# Altium footprint library 集大电协1.2.PcbLib: 197 footprints (part 12 of 13)
Each footprint in its own frame and in the unit in brackets; x right, y up, seen from the top. Pads: shape width x height; smd on the part's side, far side on the other; paste and mask are expansions set on the pad; w line width, h text height; cw(c..) or ccw(c..) is an arc to the next point about the centre after c.
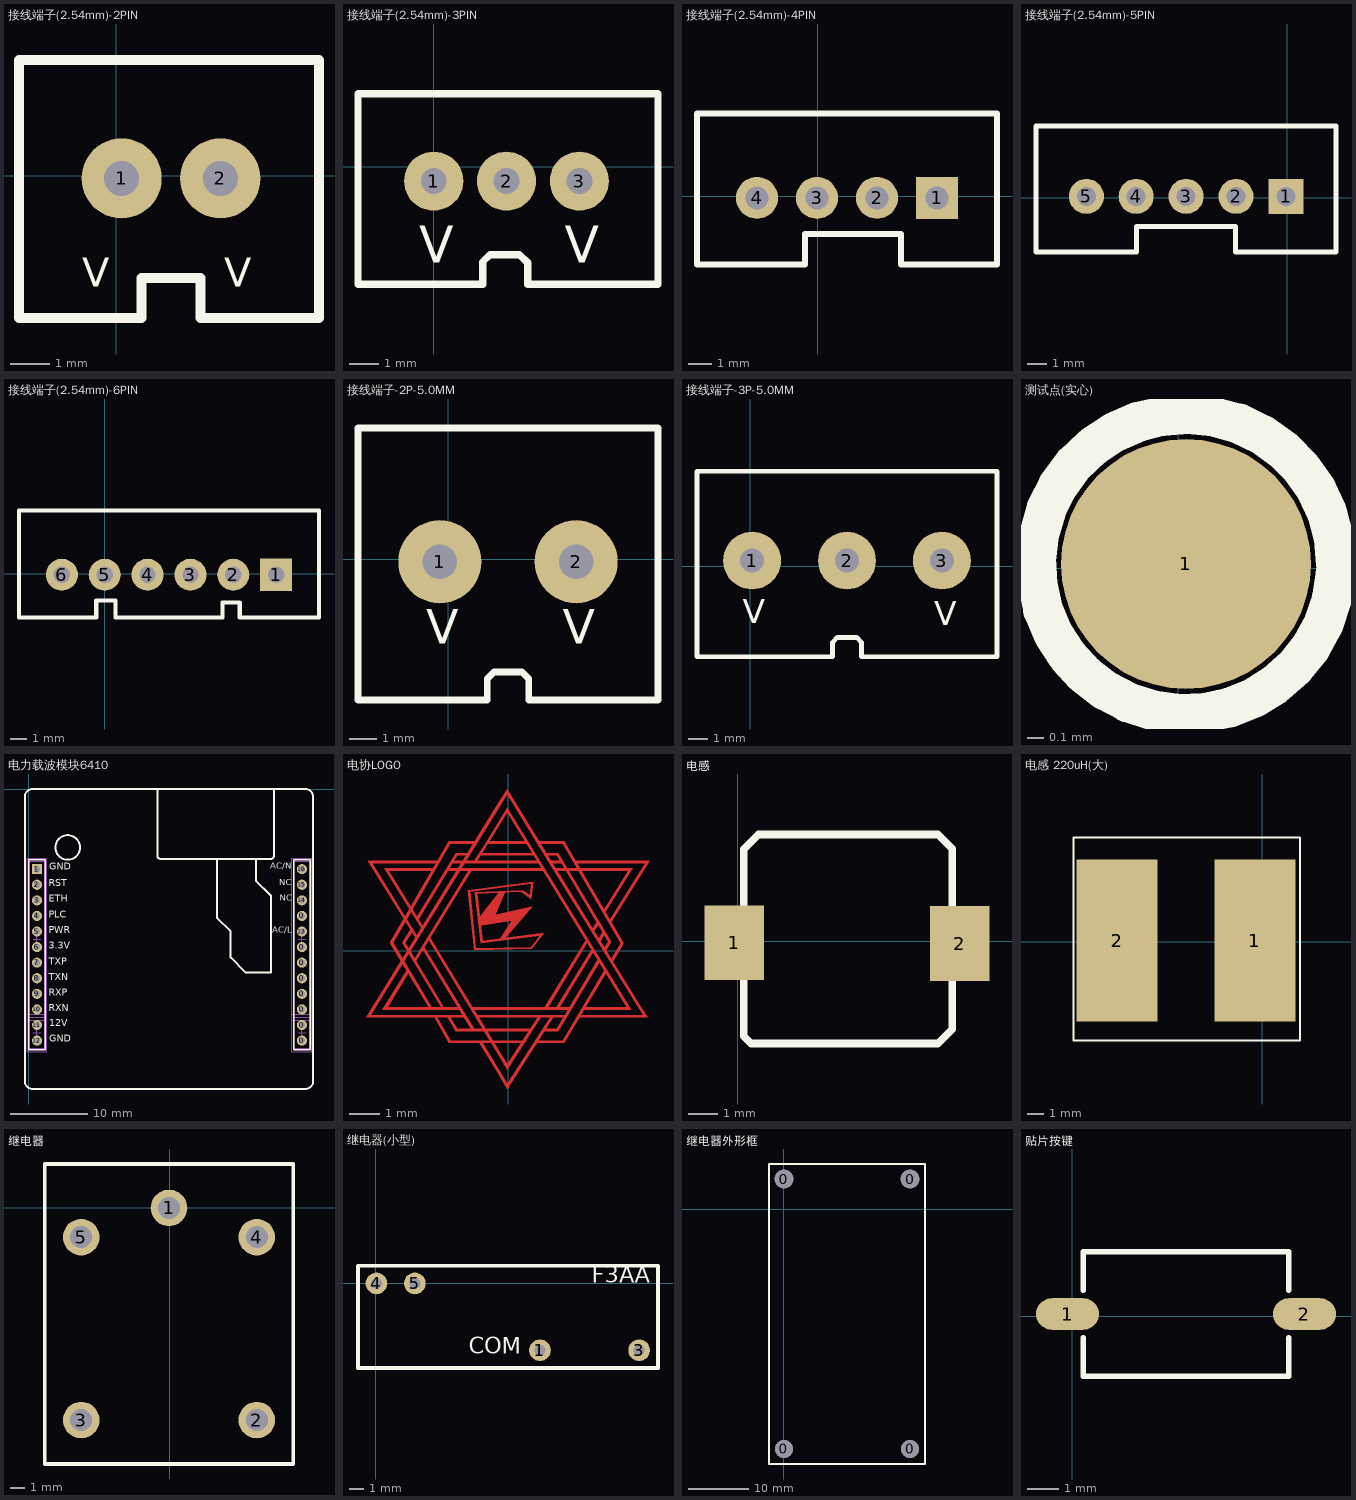
[diagram p11: the footprints below, top view; thin cyan lines are the x and y axes]

## 接线端子(2.54mm)-2PIN [mil]
pads (2):
  round 80 hole 35: 1(5.42,-2.44) 2(103.84,-2.44)
Top Overlay:
  lines w10: 141.42,-141.76 202.27,-141.76 202.27,115.67 -96.94,115.67 -96.94,-141.76 25.1,-141.76 25.1,-101.76 84.16,-101.76 84.16,-141.76 151.42,-141.76
  text "V" at -33.95,-120.55 h50
  text "V" at 107.78,-120.55 h50
3D body: height 459.84, standoff -140.16, extent -48.52,-139.05 151.48,110.95

## 接线端子(2.54mm)-3PIN [mil]
pads (3):
  round 80 hole 35: 1(0,-19.68) 2(98.43,-19.68) 3(196.85,-19.68)
Top Overlay:
  lines w10: 136,-159 303.15,-159 303.15,98.43 -102.36,98.43 -102.36,-159 66,-159 66,-129 76,-119 116,-119 127,-130 127,-159 146,-159
  text "V" at 177.17,-129.92 h50
  text "V" at -19.68,-129.92 h50
3D body: height 459.84, standoff -140.16, extent -51.57,-157.48 248.43,92.52

## 接线端子(2.54mm)-4PIN [mil]
pads (4):
  rect 70x70 hole 38: 1(199.11,-3)
  round 70 hole 38: 2(99.11,-3) 3(-0.89,-3) 4(-100.89,-3)
Top Overlay:
  lines w10: -200.89,-114.17 -200.89,137.8 299.11,137.8 299.11,-114.17 139.11,-114.17 139.11,-63 -0.89,-63 -20.89,-63 -20.89,-114.17 -200.89,-114.17
3D body: height 459.84, standoff -140.16, extent -148.82,-118.11 251.18,131.89

## 接线端子(2.54mm)-5PIN [mil]
pads (5):
  rect 70x70 hole 38: 1(-2.66,2.91)
  round 70 hole 38: 2(-102.66,2.91) 3(-202.66,2.91) 4(-302.66,2.91) 5(-402.07,2.91)
Top Overlay:
  lines w10: -502.95,-108.27 -502.95,143.7 97.34,143.7 97.34,-108.27 -103.35,-108.27 -103.35,-57.09 -202.66,-57.09 -302.17,-57.09 -302.17,-108.27 -502.95,-108.27
3D body: height 236.22, standoff -98.43, extent -493.11,-78.74 97.44,70.87

## 接线端子(2.54mm)-6PIN [mil]
pads (6):
  rect 75x75 hole 38: 1(399.35,-2.1)
  round 75 hole 38: 2(299.35,-2.1) 3(199.35,-2.1) 4(99.35,-2.1) 5(-0.65,-2.1) 6(-100.65,-2.1)
Top Overlay:
  lines w10: -200.65,-102.1 -20.65,-102.1 -20.65,-62.1 14.35,-62.1 24.35,-62.1 24.35,-102.1 274.35,-102.1 274.35,-67.1 314.35,-67.1 314.35,-102.1 499.35,-102.1 499.35,147.9 -200.65,147.9 -200.65,-102.1
3D body: height 236.22, standoff -78.74, extent -125.98,-74.8 425.2,102.36

## 接线端子-2P-5.0MM [mil]
pads (2):
  round 120 hole 50: 1(-11.81,-3.94) 2(185.04,-3.94)
Top Overlay:
  lines w10: -129.92,-203.31 56.61,-203.31 56.61,-173.31 66.61,-163.31 106.61,-163.31 116.61,-173.31 116.61,-203.31 136.61,-203.31 ; -129.92,-200.79 -129.92,188.98 303.15,188.98 303.15,-200.79 ; 126.61,-203.31 303.15,-203.31
  text "V" at 165.35,-122.05 h50
  text "V" at -31.5,-122.05 h50
3D body: height 433.07, standoff -78.74, extent -106.3,-153.54 287.4,161.42

## 接线端子-3P-5.0MM [mil]
pads (3):
  round 120 hole 50: 1(3.94,11.81) 2(200.79,11.81) 3(397.64,11.81)
Top Overlay:
  lines w10: -110.24,-187.56 170.79,-187.56 170.79,-157.56 180.79,-147.56 220.79,-147.56 230.79,-157.56 230.79,-187.56 511.81,-187.56 511.81,196.85 -110.24,196.85 -110.24,-187.56
  text "V" at -15.75,-118.11 h50
  text "V" at 381.89,-122.05 h50
3D body: height 433.07, standoff -78.74, extent -94.49,-153.54 496.06,161.42

## 测试点(实心) [mm]
pads (1):
  round 1.5 all layers, no hole: 1(0.048,0.025)
Top Overlay:
  lines w0.24: 0.946,-0.035 cw(c0.048,0.025) 0.948,0.025

## 电力载波模块6410 [mm]
pads (24):
  round 1.3 hole 0.8: 0(35.059,-32.289) 0(35.059,-30.289) 0(35.059,-28.289) 0(35.059,-26.289) 0(35.059,-24.289) 0(35.059,-22.289) 0(35.059,-20.289) 0(35.059,-16.289) 2(1.059,-12.289) 3(1.059,-14.289) 4(1.059,-16.289) 5(1.059,-18.289) 6(1.059,-20.289) 7(1.059,-22.289) 8(1.059,-24.289) 9(1.059,-26.289) 10(1.059,-28.289) 11(1.059,-30.289) 12(1.059,-32.289) 13(35.059,-18.289) 14(35.059,-14.289) 15(35.059,-12.289) 16(35.059,-10.289)
  rect 1.3x1.3 hole 0.8: 1(1.059,-10.289)
Top Overlay:
  circle w0.254: c5,-7.5 r1.581
  lines w0.2: -0.016,-29.489 -0.016,-9.089 2.134,-9.089 2.134,-29.489 ; -0.016,-29.089 -0.016,-33.489 2.134,-33.489 2.134,-29.089 ; 33.984,-29.489 33.984,-9.089 36.134,-9.089 36.134,-29.489 ; 33.984,-29.089 33.984,-33.489 36.134,-33.489 36.134,-29.089
  lines w0.254: 16.5,0 16.5,-8.5 ccw(c17,-8.5) 17,-9 31,-9 ccw(c31,-8.5) 31.5,-8.5 31.5,0 ; 24.181,-9.068 24.181,-16.561 24.206,-16.561 25.908,-18.263 25.908,-19.279 25.908,-21.59 ; 25.933,-21.615 25.908,-21.59 ; 29.159,-9.144 29.159,-11.76 31.064,-13.665 31.064,-23.52 27.813,-23.52 25.908,-21.615 25.908,-21.59 ; -0.5,-37.5 ccw(c0.5,-37.5) 0.5,-38.5 35.5,-38.5 ccw(c35.5,-37.5) 36.5,-37.5 36.5,-1 ccw(c35.5,-1) 35.5,0 0.5,0 ccw(c0.5,-1) -0.5,-1 -0.5,-37.5
  text "NC" at 32.182,-14.63 h1.4
  text "NC" at 32.156,-12.675 h1.4
  text "AC/L" at 31.242,-18.745 h1.4
  text "AC/N" at 30.963,-10.541 h1.4
  text "GND" at 2.642,-32.766 h1.52
  text "12V" at 2.64,-30.773 h1.52
  text "RXN" at 2.54,-28.867 h1.52
  text "RXP" at 2.54,-26.86 h1.52
  text "TXN" at 2.542,-24.854 h1.52
  text "TXP" at 2.542,-22.847 h1.52
  text "3.3V" at 2.54,-20.826 h1.52
  text "PWR" at 2.54,-18.834 h1.52
  text "PLC" at 2.54,-16.813 h1.52
  text "ETH" at 2.54,-14.821 h1.52
  text "RST" at 2.54,-12.8 h1.52
  text "GND" at 2.642,-10.693 h1.52
Mechanical 13:
  lines w0.1: 0.059,-29.289 2.059,-29.289 ; 0.059,-29.289 0.059,-33.289 2.059,-33.289 2.059,-29.289 ; 0.059,-29.289 0.059,-9.289 2.059,-9.289 2.059,-29.289 ; 0.059,-29.289 2.059,-29.289 ; 34.059,-29.289 36.059,-29.289 ; 34.059,-29.289 34.059,-9.289 36.059,-9.289 36.059,-29.289 ; 34.059,-29.289 34.059,-33.289 36.059,-33.289 36.059,-29.289 ; 34.059,-29.289 36.059,-29.289
Mechanical 15:
  lines w0.05: 0.559,-31.289 1.559,-31.289 ; 0.559,-19.289 1.559,-19.289 ; 1.059,-31.789 1.059,-30.789 ; 1.059,-19.789 1.059,-18.789 ; 34.559,-31.289 35.559,-31.289 ; 34.559,-19.289 35.559,-19.289 ; 35.059,-31.789 35.059,-30.789 ; 35.059,-19.789 35.059,-18.789 ; -0.216,-33.689 -0.216,-28.889 2.334,-28.889 2.334,-33.689 -0.216,-33.689 ; -0.216,-29.689 -0.216,-8.889 2.334,-8.889 2.334,-29.689 -0.216,-29.689 ; 33.784,-33.689 36.334,-33.689 36.334,-28.889 33.784,-28.889 33.784,-33.689 ; 33.784,-29.689 36.334,-29.689 36.334,-8.889 33.784,-8.889 33.784,-29.689
3D body "62001011821.stp": height 4.35, standoff -2.65, extent 33.897,-29.42 36.397,-8.92
3D body "62000211821.stp": height 4.35, standoff -2.65, extent 33.887,-33.466 36.387,-28.966
3D body "62000211821.stp": height 4.35, standoff -2.65, extent -0.149,-33.416 2.351,-28.916
3D body "62001011821.stp": height 4.35, standoff -2.65, extent -0.139,-29.369 2.361,-8.869

## 电协LOGO [mm]
Top Layer:
  region: -0.307,1.911 -0.961,1.079 -0.917,0.832 0.124,0.984 -0.282,0.374 -0.13,0.374 0.81,1.467 -0.422,1.187 -0.092,1.949
  region: -0.028,5.327 -0.307,4.896 -4.676,-2.191 -4.473,-2.191 -1.45,-2.192 -1.4,-2.115 -1.568,-1.834 -1.654,-1.861 -3.965,-1.861 -3.279,-0.743 -3.33,-0.642 -4.143,-1.937 -1.603,-1.937 -1.488,-2.115 -4.524,-2.115 -0.028,5.15 1.344,2.914 4.442,-2.115 2.41,-2.115 2.36,-2.191 4.595,-2.191 4.341,-1.785
  region: -1.12,2.965 -0.765,3.499 -0.028,4.718 4.061,-1.937 2.512,-1.937 2.563,-1.861 3.909,-1.861 -0.028,4.565 -1.019,2.965
  region: 1.242,3.219 1.648,3.219 3.401,0.298 3.223,-0.007 3.172,0.095 3.299,0.298 1.598,3.143 1.293,3.143
  region: -1.171,-1.861 0.607,-1.861 2.029,-1.861 2.004,-1.937 -1.171,-1.937
  region: -1.019,-2.115 0.759,-2.115 1.928,-2.115 1.902,-2.191 -1.019,-2.191
  region: -1.679,-2.572 -0.612,-2.572 0.81,-2.572 0.785,-2.648 -1.73,-2.648 -2.009,-2.166 -1.908,-2.191
  region: 1.013,3.6 1.852,3.6 3.807,0.247 3.426,-0.388 3.376,-0.286 3.706,0.247 1.801,3.524 1.013,3.524
  region: -1.095,3.6 -1.957,3.6 -3.889,0.273 -2.58,-1.909 -2.517,-1.861 -3.787,0.273 -1.908,3.524 -1.095,3.524
  region: -2.314,2.965 -4.625,2.965 -3.025,0.4 -2.974,0.451 -4.473,2.889 -2.365,2.889
  region: -2.428,2.711 -4.079,2.711 -2.847,0.73 -2.771,0.755 -3.927,2.635 -2.517,2.635
  region: -1.298,2.66 -3.089,-0.273 -3.038,-0.349 -1.196,2.66
  region: 2.588,0.4 1.191,-1.873 1.217,-1.912 1.318,-1.861 2.639,0.324
  region: 2.791,0.095 1.572,-1.886 1.674,-1.912 2.842,0.019
  region: 2.966,-0.266 1.598,-2.572 1.217,-2.572 1.191,-2.648 1.648,-2.648 3.045,-0.311
  region: 3.198,-0.591 1.801,-2.953 0.963,-2.953 0.912,-3.029 1.852,-3.029 3.249,-0.692
  region: -3.178,0.654 -3.193,0.746 -3.482,0.273 -2.173,-1.909 -2.111,-1.861 -3.381,0.273 -3.119,0.671
  region: -1.895,-2.953 -0.828,-2.953 0.594,-2.953 0.569,-3.029 -1.946,-3.029 -2.454,-2.14 -2.352,-2.166
  region: -0.942,-3.029 -0.333,-4.02 -0.021,-4.549 1.521,-2.14 1.42,-2.14 -0.021,-4.375 -0.866,-2.978 -0.942,-3.004
  region: -2.613,0.364 -0.333,-3.385 -0.021,-3.914 1.115,-2.14 1.013,-2.14 -0.021,-3.74 -0.866,-2.343 -2.593,0.476
  region: -2.816,0.06 -1.192,-2.61 -1.108,-2.61 -1.117,-2.57 -2.797,0.171
  region: 0.836,2.279 0.759,1.695 0.429,1.949 0.48,2 0.709,1.822 0.759,2.203 -1.247,1.949 -1.057,0.082 0.759,0.12 1.039,0.501 -0.892,0.247 -1.095,1.924 0.48,2 0.455,1.975 0.429,1.949 -1.019,1.873 -0.841,0.324 1.064,0.578 1.191,0.603 0.785,0.07 -1.12,0.019 -1.323,2
  region: -1.781,2.965 0.988,2.965 0.988,2.94 1.013,2.889 -1.831,2.889
  region: -2.009,2.635 -1.958,2.711 1.115,2.711 1.166,2.635
  region: -0.942,3.219 0.836,3.219 0.81,3.219 0.861,3.194 0.861,3.143 -0.993,3.143
  region: -1.323,3.219 -1.73,3.219 -3.013,1.098 -2.949,1.035 -1.679,3.143 -1.374,3.143
  region: 1.75,2.965 1.394,2.965 1.344,2.914 1.445,2.914 1.471,2.889 1.75,2.889
  region: 1.928,2.711 1.572,2.711 1.521,2.66 1.598,2.635 1.623,2.635 1.648,2.635 1.928,2.635
  region: -0.663,3.6 0.607,3.6 0.632,3.575 0.658,3.549 0.683,3.524 -0.714,3.524
  region: 2.207,2.965 4.646,2.965 4.671,2.965 3.401,0.933 3.337,0.997 4.519,2.889 2.233,2.889
  region: 1.648,2.711 4.087,2.711 4.112,2.711 3.172,1.213 3.147,1.34 3.96,2.635 1.674,2.635
  region: 2.766,0.705 2.918,0.959 2.969,0.908 2.969,0.857 2.842,0.654 2.791,0.654
  region: 2.969,0.374 3.122,0.628 3.172,0.578 3.172,0.527 3.045,0.324 2.995,0.324
  text "协" at 0.201,-1.683 h0.76
  text "电" at -0.739,-1.683 h0.76
  text "大" at 1.115,-0.794 h0.76
  text "集" at -1.552,-0.794 h0.76
Top Solder:
  drawing of 33 lines, arcs and shapes, not listed
  text "集" at -1.552,-0.794 h0.76
  text "大" at 1.115,-0.794 h0.76
  text "电" at -0.739,-1.683 h0.76
  text "协" at 0.201,-1.683 h0.76

## 电感 [mm]
pads (2):
  rect 2x2.5 smd: 1(-0.12,-0.044) 2(7.423,-0.069)
Top Overlay:
  lines w0.254: 0.19,-3.167 0.44,-3.417 6.69,-3.417 7.175,-2.932 7.175,3.098 6.69,3.583 0.69,3.583 0.19,3.083 0.19,-3.167
3D body "User Library-Inductor VLC6045 Series.STEP": height 4.5, standoff 0, extent 0.636,-2.981 6.636,3.019

## 电感 220uH(大) [mm]
pads (2):
  rect 5x10 smd: 1(-0.444,0.06) 2(-8.944,0.06)
Top Overlay:
  lines w0.127: -11.62,-6.09 -11.62,6.41 2.325,6.41 2.325,-6.09 -11.62,-6.09
3D body: height 4, standoff 0, extent -8.597,-3.279 -1.485,3.833

## 继电器 [mil]
pads (5):
  round 100 hole 60: 1(-2.19,-1.05) 2(237.81,-581.05) 3(-242.19,-581.05) 4(237.81,-81.05) 5(-242.19,-81.05)
Top Overlay:
  lines w10: -342.19,58.95 -342.19,118.95 337.81,118.95 ; -342.19,78.95 -342.19,-701.05 337.81,-701.05 337.81,78.95 337.81,118.95 ; -262.19,118.95 337.81,118.95
3D body "继电器.ST": height 587.01, standoff -98.43, extent -330.71,-732.28 334.65,133.86

## 继电器(小型) [mil] "F3AA (20mm*7mm)"
pads (4):
  round 60 hole 30: 1(454.72,-186.02) 3(729.33,-186.02) 4(1.97,-0.98) 5(108.27,-0.98)
Top Overlay:
  lines w10: -49.21,-235.24 -49.21,48.23 781.5,48.23 781.5,-235.24 -49.21,-235.24
  text "F3AA" at 597.44,-14.76 h78.74
  text "COM" at 257.87,-211.61 h78.74
Mechanical 1:
3D body: height 590.55, standoff 0, extent -50.2,-232.28 780.51,49.21

## 继电器外形框 [mm]
pads (4):
  round 3 hole 3: 0(0,-40) 0(21,-40)
  round 3.1 hole 3.1: 0(0,5) 0(21,5)
Top Overlay:
  lines w0.254: -2.5,-42.5 23.5,-42.5 23.5,7.5 7.5,7.5 -2.5,7.5 -2.5,-42.5
3D body: height 20, standoff 10, extent -2.5,-42.5 23.5,7.5
3D body: height 15, standoff 0, extent -1.542,3.452 1.55,6.548
3D body: height 15, standoff 0, extent 19.458,3.452 22.55,6.548
3D body: height 15, standoff 0, extent 19.458,-41.548 22.55,-38.452
3D body: height 15, standoff 0, extent -1.542,-41.548 1.55,-38.452
3D body: height 25, standoff 15, extent 4.5,-35 17.5,-17.5

## 贴片按键 [mil]
pads (2):
  oval 80x40 smd: 1(-5.71,2.8) 2(294.29,2.8)
Top Overlay:
  lines w7: 14.13,-27.2 14.13,-75.94 274.19,-75.94 274.45,-27.21 ; 14.13,32.8 14.13,81.54 274.29,81.54 274.29,32.8
3D body: height 47.24, standoff 31.5, extent 94.29,-27.2 194.29,32.8
3D body "TVBU19.STEP": height 98.43, standoff 0, extent 24.22,-69.03 264.38,76.64